# Altium footprint library cool_library.PcbLib: 1182 footprints (part 44 of 75)
Each footprint in its own frame and in the unit in brackets; x right, y up, seen from the top. Pads: shape width x height; smd on the part's side, far side on the other; paste and mask are expansions set on the pad; w line width, h text height; cw(c..) or ccw(c..) is an arc to the next point about the centre after c.
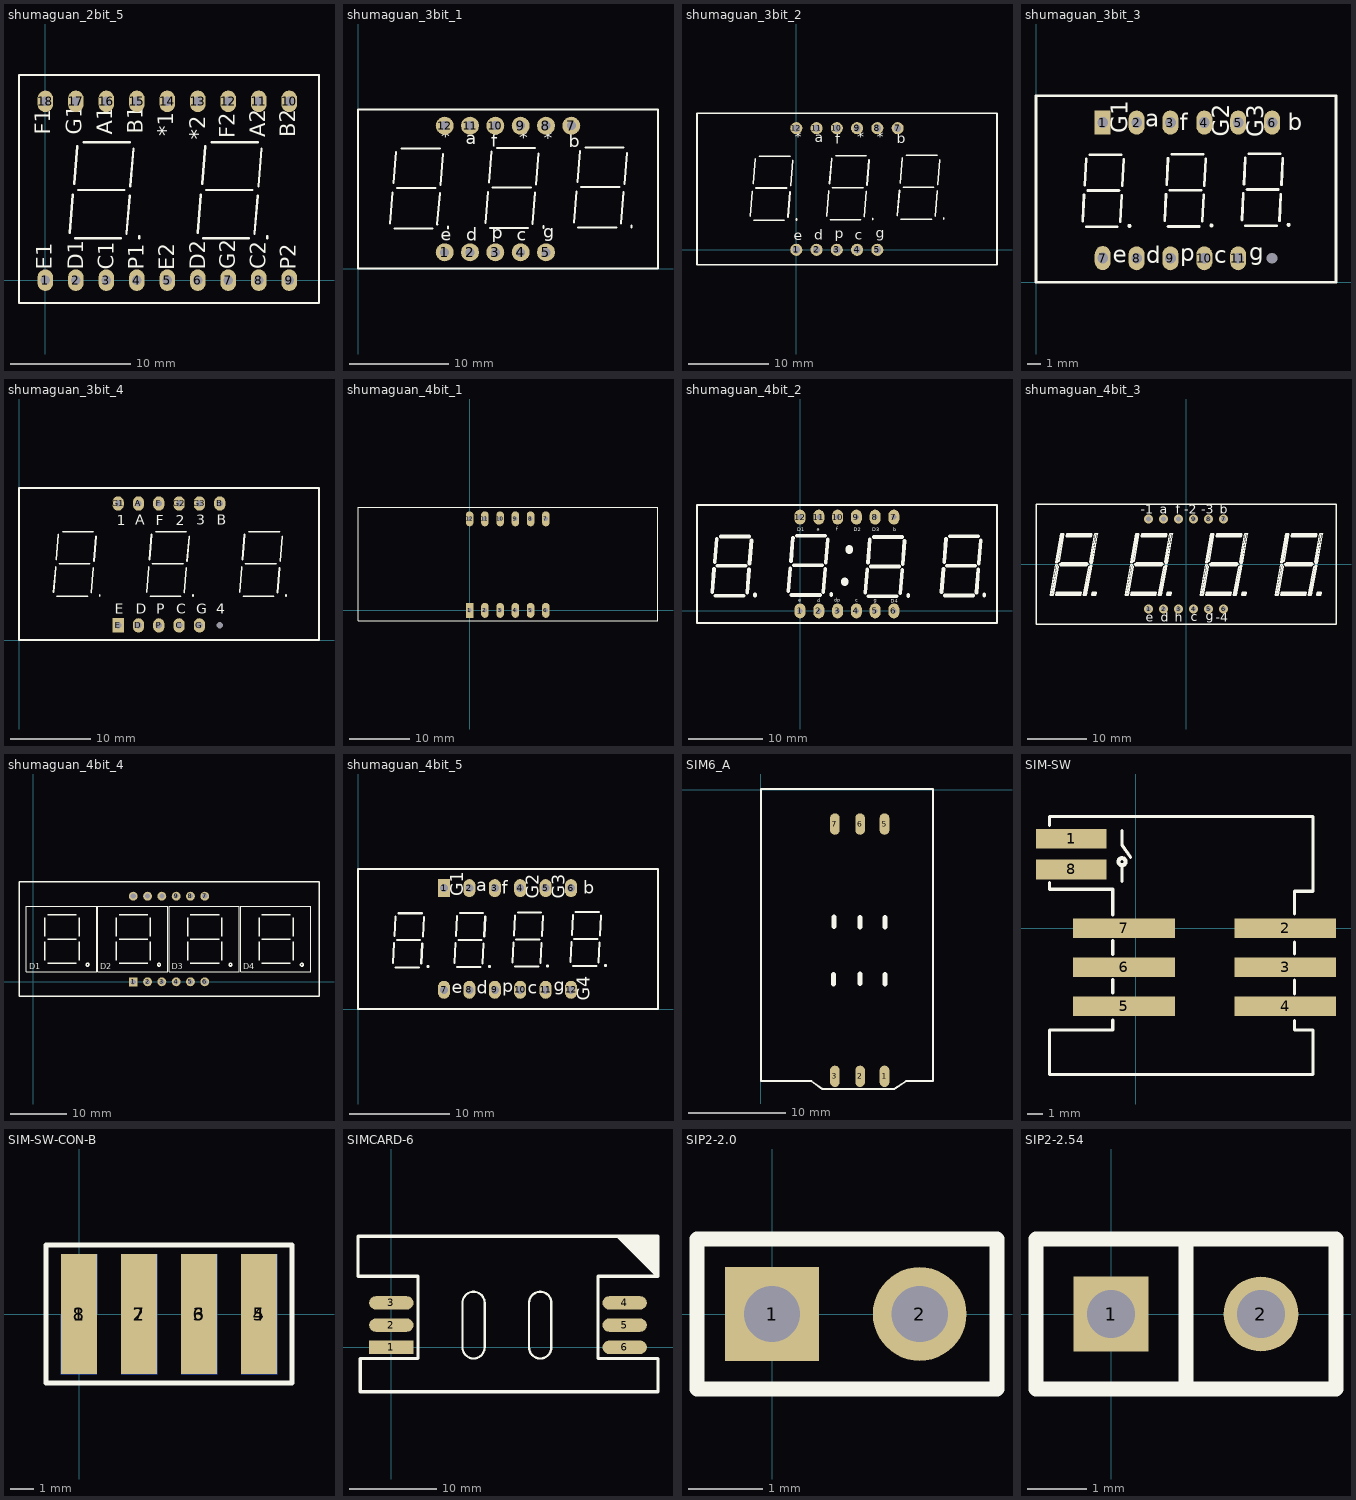
[diagram p43: the footprints below, top view; thin cyan lines are the x and y axes]

## shumaguan_2bit_5 [mm]
pads (18):
  oval 1.3x1.8 hole 0.8: 1(0,0) 2(2.54,0) 3(5.08,0) 4(7.62,0) 5(10.16,0) 6(12.7,0) 7(15.24,0) 8(17.78,0) 9(20.32,0) 10(20.32,14.9) 11(17.78,14.9) 12(15.24,14.9) 13(12.7,14.9) 14(10.16,14.9) 15(7.62,14.9) 16(5.08,14.9) 17(2.54,14.9) 18(0,14.9)
Bottom Layer:
  lines w0.2: 22.8,17 22.8,17.1
Top Overlay:
  lines w0.203: 2.034,3.962 2.288,7.112 ; 2.389,8.026 2.643,11.176 ; 2.465,3.48 6.301,3.48 ; 2.745,7.518 6.58,7.518 ; 3.177,11.506 7.012,11.506 ; 6.758,3.886 7.012,7.036 ; 7.088,7.823 7.342,10.973 ; 7.825,3.48 7.825,3.658 ; 12.702,3.962 12.956,7.112 ; 13.057,8.026 13.311,11.176 ; 13.133,3.48 16.969,3.48 ; 13.413,7.518 17.248,7.518 ; 13.845,11.506 17.68,11.506 ; 17.426,3.886 17.68,7.036 ; 17.756,7.823 18.01,10.973 ; 18.493,3.48 18.493,3.658 ; 22.8,17 22.8,-1.9 -2.2,-1.9 -2.2,17.1 22.8,17.1
  text "A1" at 5.588,12.116 h1.27
  text "A2" at 18.313,11.913 h1.27
  text "B1" at 8.103,12.192 h1.27
  text "B2" at 20.828,11.913 h1.27
  text "C1" at 5.715,0.864 h1.27
  text "C2" at 18.364,0.914 h1.27
  text "D1" at 3.175,0.889 h1.27
  text "D2" at 13.31,0.864 h1.27
  text "E1" at 0.533,0.889 h1.27
  text "E2" at 10.719,0.838 h1.27
  text "F1" at 0.406,12.116 h1.27
  text "F2" at 15.799,11.836 h1.27
  text "G1" at 3.023,12.116 h1.27
  text "G2" at 15.824,0.914 h1.27
  text "P1" at 8.204,0.889 h1.27
  text "P2" at 20.879,0.889 h1.27
  text "*1" at 10.643,11.989 h1.27
  text "*2" at 13.335,11.709 h1.27

## shumaguan_3bit_1 [mm]
pads (11):
  round 1.8 hole 0.9: 1(8.7,1.65) 2(11.24,1.65) 3(13.78,1.65) 4(16.32,1.65) 5(18.86,1.65) 7(21.4,14.35) 8(18.86,14.35) 9(16.32,14.35) 10(13.78,14.35) 11(11.24,14.35) 12(8.7,14.35)
Top Overlay:
  lines w0.203: 3.226,4.521 3.48,7.671 ; 3.581,8.585 3.835,11.735 ; 3.658,4.039 7.493,4.039 ; 3.937,8.077 7.772,8.077 ; 4.369,12.065 8.204,12.065 ; 7.95,4.445 8.204,7.595 ; 8.28,8.382 8.534,11.532 ; 9.017,4.039 9.017,4.216 ; 12.802,4.572 13.056,7.722 ; 13.157,8.636 13.411,11.786 ; 13.233,4.089 17.069,4.089 ; 13.513,8.128 17.348,8.128 ; 13.945,12.116 17.78,12.116 ; 17.526,4.496 17.78,7.645 ; 17.856,8.433 18.11,11.582 ; 18.593,4.089 18.593,4.267 ; 21.666,4.623 21.92,7.772 ; 22.022,8.687 22.276,11.836 ; 22.098,4.14 25.933,4.14 ; 22.377,8.179 26.213,8.179 ; 22.809,12.167 26.645,12.167 ; 26.391,4.547 26.645,7.696 ; 26.721,8.484 26.975,11.633 ; 27.457,4.14 27.457,4.318 ; 0,0 30.1,0 30.1,16 0,16 0,0
  text "e" at 8.305,2.794 h1.27
  text "d" at 10.871,2.819 h1.27
  text "c" at 15.926,2.819 h1.27
  text "p" at 13.437,3.023 h1.27
  text "*" at 8.331,12.624 h1.27
  text "g" at 18.567,3.099 h1.27
  text "f" at 13.36,12.243 h1.27
  text "b" at 21.158,12.167 h1.27
  text "*" at 16.18,12.548 h1.27
  text "a" at 10.82,12.471 h1.27
  text "*" at 18.618,12.497 h1.27

## shumaguan_3bit_2 [mil]
pads (11):
  round 60 hole 35.43: 1(0,0) 2(100,0) 3(200,0) 4(300,0) 5(400,0) 7(500,600) 8(400,600) 9(300,600) 10(200,600) 11(100,600) 12(0,600)
Top Overlay:
  lines w8: -490,674 990.32,674 ; -490,674.03 -490,-74 990.32,-74 990.32,674.03 ; -227,165 -217,289 ; -213,325 -203,449 ; -210,146 -59,146 ; -199,305 -48,305 ; -182,462 -31,462 ; -41,162 -31,286 ; -28,317 -18,441 ; 1,146 1,153 ; 150,167 160,291 ; 164,327 174,451 ; 167,148 318,148 ; 178,307 329,307 ; 195,464 346,464 ; 336,164 346,288 ; 349,319 359,443 ; 378,148 378,155 ; 499,169 509,293 ; 513,329 523,453 ; 516,150 667,150 ; 527,309 678,309 ; 544,466 695,466 ; 685,166 695,290 ; 698,321 708,445 ; 727,150 727,157
  text "e" at -12,48 h50
  text "d" at 89,49 h50
  text "c" at 288,49 h50
  text "p" at 190,57 h50
  text "*" at -8,534 h50
  text "g" at 392,60 h50
  text "f" at 192,523 h50
  text "b" at 496,525 h50
  text "*" at 301,534 h50
  text "a" at 90,530 h50
  text "*" at 397,533 h50

## shumaguan_3bit_3 [mm]
pads (12):
  rect 1.2x1.8 hole 0.8: 1(5.004,11.982)
  oval 1.2x1.8 hole 0.8: 2(7.544,11.982) 3(10.084,11.982) 4(12.624,11.982) 5(15.164,11.982) 6(17.704,11.982) 7(5.004,1.822) 8(7.544,1.806) 9(10.084,1.806) 10(12.624,1.806) 11(15.164,1.806)
  round 0 hole 0.8: 12(17.704,1.806)
Top Overlay:
  circle w0.25: c7.01,4.242 r0.025
  circle w0.25: c13.157,4.267 r0.025
  circle w0.25: c18.948,4.318 r0.025
  lines w0.203: 3.505,4.597 3.607,6.579 ; 3.658,7.29 3.759,9.271 ; 3.759,4.166 6.096,4.166 ; 3.886,6.883 6.223,6.883 ; 4.039,9.576 6.375,9.576 ; 6.325,4.547 6.426,6.528 ; 6.477,7.239 6.579,9.22 ; 9.652,4.623 9.754,6.604 ; 9.804,7.315 9.906,9.296 ; 9.906,4.191 12.243,4.191 ; 10.033,6.909 12.37,6.909 ; 10.185,9.601 12.522,9.601 ; 12.471,4.572 12.573,6.553 ; 12.624,7.264 12.725,9.246 ; 15.443,4.674 15.545,6.655 ; 15.596,7.366 15.697,9.347 ; 15.697,4.242 18.034,4.242 ; 15.824,6.96 18.161,6.96 ; 15.977,9.652 18.313,9.652 ; 18.263,4.623 18.364,6.604 ; 18.415,7.315 18.517,9.296 ; 0,0 22.5,0 22.5,14 0,14 0,0
  text "b" at 18.898,11.405 h1.27
  text "a" at 8.204,11.684 h1.27
  text "G1" at 6.883,11.176 h1.27
  text "G2" at 14.478,10.922 h1.27
  text "G3" at 17.069,10.897 h1.27
  text "c" at 13.36,1.422 h1.27
  text "d" at 8.28,1.422 h1.27
  text "e" at 5.766,1.473 h1.27
  text "f" at 10.77,11.405 h1.27
  text "g" at 15.977,1.651 h1.27
  text "p" at 10.82,1.575 h1.27

## shumaguan_3bit_4 [mm]
pads (12):
  round 0 hole 0.8: 6(25.095,1.824)
  oval 1.4x1.8 hole 0.8: A(14.935,17.064) B(25.095,17.064) C(20.015,1.824) D(14.935,1.824) F(17.475,17.064) G(22.555,1.824) G1(12.395,17.064) G2(20.015,17.064) G3(22.555,17.064) P(17.475,1.824)
  rect 1.4x1.8 hole 0.8: E(12.395,1.824)
Top Overlay:
  lines w0.203: 4.318,5.969 4.572,9.119 ; 4.674,10.033 4.928,13.183 ; 4.75,5.486 8.585,5.486 ; 5.029,9.525 8.865,9.525 ; 5.461,13.513 9.296,13.513 ; 9.042,5.893 9.296,9.042 ; 9.373,9.83 9.627,12.979 ; 10.109,5.486 10.109,5.664 ; 15.951,5.969 16.205,9.119 ; 16.307,10.033 16.561,13.183 ; 16.383,5.486 20.218,5.486 ; 16.662,9.525 20.498,9.525 ; 17.094,13.513 20.93,13.513 ; 20.676,5.893 20.93,9.042 ; 21.006,9.83 21.26,12.979 ; 21.742,5.486 21.742,5.664 ; 27.584,5.969 27.838,9.119 ; 27.94,10.033 28.194,13.183 ; 28.016,5.486 31.852,5.486 ; 28.296,9.525 32.131,9.525 ; 28.727,13.513 32.563,13.513 ; 32.309,5.893 32.563,9.042 ; 32.639,9.83 32.893,12.979 ; 33.376,5.486 33.376,5.664 ; 0,0 0,19 37.5,19 37.5,0 0,0
  text "4" at 24.663,3.277 h1.27
  text "G" at 22.149,3.277 h1.27
  text "C" at 19.66,3.251 h1.27
  text "P" at 17.145,3.277 h1.27
  text "D" at 14.58,3.251 h1.27
  text "E" at 11.938,3.277 h1.27
  text "B" at 24.689,14.376 h1.27
  text "3" at 22.149,14.376 h1.27
  text "2" at 19.609,14.351 h1.27
  text "F" at 17.069,14.351 h1.27
  text "A" at 14.529,14.427 h1.27
  text "1" at 12.217,14.351 h1.27

## shumaguan_4bit_1 [mm]
pads (12):
  rect 1.27x2.5 hole 0.7: 1(0.001,0.001)
  oval 1.27x2.5 hole 0.7: 2(2.541,0.001) 3(5.081,0.001) 4(7.621,0.001) 5(10.161,0.001) 6(12.701,0.001) 7(12.701,15.241) 8(10.161,15.241) 9(7.621,15.241) 10(5.081,15.241) 11(2.541,15.241) 12(0.001,15.241)
Top Overlay:
  lines w0.203: 31.4,-1.569 31.4,0 ; -18.6,-1.734 31.4,-1.734 31.4,17.166 -18.6,17.166 -18.6,-1.734

## shumaguan_4bit_2 [mm]
pads (12):
  oval 1.5x2 hole 0.7: 1(0,0) 2(2.54,0) 3(5.08,0) 4(7.62,0) 5(10.16,0) 6(12.695,0) 7(12.695,12.7) 8(10.16,12.7) 9(7.62,12.7) 10(5.08,12.7) 11(2.54,12.7) 12(0,12.7)
Top Overlay:
  lines w0.3: -13.95,-1.65 26.65,-1.65 26.65,14.35 -13.95,14.35 -13.95,-1.65
  lines w0.5: -11.893,2.541 -11.639,5.691 ; -11.537,6.605 -11.283,9.755 ; -11.461,2.058 -7.625,2.058 ; -11.181,6.097 -7.346,6.097 ; -10.75,10.085 -6.914,10.085 ; -7.168,2.465 -6.914,5.614 ; -6.838,6.402 -6.584,9.551 ; -6.101,2.058 -6.101,2.236 ; -1.58,2.643 -1.326,5.792 ; -1.225,6.707 -0.971,9.856 ; -1.148,2.16 2.687,2.16 ; -0.869,6.199 2.966,6.199 ; -0.437,10.186 3.398,10.186 ; 3.144,2.566 3.398,5.716 ; 3.474,6.503 3.728,9.653 ; 4.211,2.16 4.211,2.338 ; 8.834,2.465 9.088,5.614 ; 9.189,6.529 9.443,9.678 ; 9.266,1.982 13.101,1.982 ; 9.545,6.021 13.38,6.021 ; 9.977,10.009 13.812,10.009 ; 13.558,2.389 13.812,5.538 ; 13.888,6.326 14.142,9.475 ; 14.625,1.982 14.625,2.16 ; 19.146,2.566 19.4,5.716 ; 19.502,6.63 19.756,9.78 ; 19.578,2.084 23.413,2.084 ; 19.857,6.122 23.693,6.122 ; 20.289,10.11 24.125,10.11 ; 23.871,2.49 24.125,5.64 ; 24.201,6.427 24.455,9.577 ; 24.937,2.084 24.937,2.262
  lines w1: 6.065,3.862 6.065,4.04 ; 6.675,8.231 6.675,8.408
  text "dp" at 4.592,1.246 h0.5
  text "g" at 10.002,1.271 h0.5
  text "f" at 4.871,10.847 h0.5
  text "e" at -0.234,1.246 h0.5
  text "d" at 2.357,1.195 h0.5
  text "c" at 7.462,1.22 h0.5
  text "b" at 12.593,10.796 h0.5
  text "a" at 2.23,10.872 h0.5
  text "D4" at 12.237,1.093 h0.5
  text "D3" at 9.799,10.771 h0.5
  text "D2" at 7.259,10.771 h0.5
  text "D1" at -0.361,10.796 h0.5

## shumaguan_4bit_3 [mm]
pads (12):
  round 1.5 hole 0.9: 1(-6.35,-7.62) 2(-3.81,-7.62) 3(-1.27,-7.62) 4(1.27,-7.62) 5(3.81,-7.62) 6(6.35,-7.62) 7(6.35,7.62) 8(3.81,7.62) 9(1.27,7.62) 10(-1.27,7.62) 11(-3.81,7.62) 12(-6.35,7.62)
Top Overlay:
  drawing of 188 lines, arcs and shapes, not listed
  text "-1" at -7.645,8.484 h1.52
  text "a" at -4.445,8.509 h1.52
  text "f" at -1.778,8.509 h1.52
  text "-2" at -0.305,8.484 h1.52
  text "-3" at 2.591,8.484 h1.52
  text "b" at 5.715,8.509 h1.52
  text "-4" at 5.055,-9.804 h1.52
  text "g" at 3.302,-9.525 h1.52
  text "c" at 0.762,-9.652 h1.52
  text "h" at -1.905,-9.779 h1.52
  text "d" at -4.318,-9.779 h1.52
  text "e" at -6.858,-9.779 h1.52

## shumaguan_4bit_4 [mil]
pads (12):
  rect 62x62 hole 36: 1(700,0)
  round 62 hole 36: 2(800,0) 3(900,0) 4(1000,0) 5(1100,0) 6(1200,0) 7(1200,600) 8(1100,600) 9(1000,600) 10(900,600) 11(800,600) 12(700,600)
Top Overlay:
  circle w10: c1880,120 r10
  circle w10: c1380,120 r10
  circle w10: c880,120 r10
  circle w10: c380,120 r10
  lines w7.87: -49.21,70.28 442.91,70.28 442.91,528.15 -49.21,528.15 -49.21,323.82 -49.21,70.28 ; 450.79,70.28 942.91,70.28 942.91,528.15 450.79,528.15 450.79,323.82 450.79,70.28 ; 950.79,70.28 1442.91,70.28 1442.91,528.15 950.79,528.15 950.79,323.82 950.79,70.28 ; 1450.79,70.28 1942.91,70.28 1942.91,528.15 1450.79,528.15 1450.79,323.82 1450.79,70.28
  lines w10: 80,150 80,280 ; 80,320 80,450 ; 100,130 300,130 ; 100,300 300,300 ; 100,470 300,470 ; 320,150 320,280 ; 320,320 320,450 ; 580,150 580,280 ; 580,320 580,450 ; 600,130 800,130 ; 600,300 800,300 ; 600,470 800,470 ; 820,150 820,280 ; 820,320 820,450 ; 1080,150 1080,280 ; 1080,320 1080,450 ; 1100,130 1300,130 ; 1100,300 1300,300 ; 1100,470 1300,470 ; 1320,150 1320,280 ; 1320,320 1320,450 ; 1580,150 1580,280 ; 1580,320 1580,450 ; 1600,130 1800,130 ; 1600,300 1800,300 ; 1600,470 1800,470 ; 1820,150 1820,280 ; 1820,320 1820,450 ; -100,-100 -100,700 2000,700 2000,-100 -100,-100
  text "D4" at 1470,90 h40
  text "D3" at 970,90 h40
  text "D2" at 470,90 h40
  text "D1" at -30,90 h40

## shumaguan_4bit_5 [mm]
pads (12):
  rect 1.2x1.8 hole 0.8: 1(8.6,12.084)
  oval 1.2x1.8 hole 0.8: 2(11.14,12.084) 3(13.68,12.084) 4(16.22,12.084) 5(18.76,12.084) 6(21.3,12.084) 7(8.6,1.924) 8(11.14,1.924) 9(13.68,1.924) 10(16.22,1.924) 11(18.76,1.924) 12(21.3,1.924)
Top Overlay:
  circle w0.25: c7.01,4.242 r0.025
  circle w0.25: c13.157,4.267 r0.025
  circle w0.25: c18.948,4.318 r0.025
  circle w0.25: c24.74,4.369 r0.025
  lines w0.203: 3.505,4.597 3.607,6.579 ; 3.658,7.29 3.759,9.271 ; 3.759,4.166 6.096,4.166 ; 3.886,6.883 6.223,6.883 ; 4.039,9.576 6.375,9.576 ; 6.325,4.547 6.426,6.528 ; 6.477,7.239 6.579,9.22 ; 9.652,4.623 9.754,6.604 ; 9.804,7.315 9.906,9.296 ; 9.906,4.191 12.243,4.191 ; 10.033,6.909 12.37,6.909 ; 10.185,9.601 12.522,9.601 ; 12.471,4.572 12.573,6.553 ; 12.624,7.264 12.725,9.246 ; 15.443,4.674 15.545,6.655 ; 15.596,7.366 15.697,9.347 ; 15.697,4.242 18.034,4.242 ; 15.824,6.96 18.161,6.96 ; 15.977,9.652 18.313,9.652 ; 18.263,4.623 18.364,6.604 ; 18.415,7.315 18.517,9.296 ; 21.234,4.724 21.336,6.706 ; 21.387,7.417 21.488,9.398 ; 21.488,4.293 23.825,4.293 ; 21.615,7.01 23.952,7.01 ; 21.768,9.703 24.105,9.703 ; 24.054,4.674 24.155,6.655 ; 24.206,7.366 24.308,9.347 ; 0,0 30,0 30,14 0,14 0,0
  text "G4" at 23.18,0.822 h1.27
  text "p" at 14.417,1.683 h1.27
  text "g" at 19.573,1.759 h1.27
  text "f" at 14.391,11.513 h1.27
  text "e" at 9.362,1.581 h1.27
  text "d" at 11.877,1.531 h1.27
  text "c" at 16.957,1.531 h1.27
  text "G3" at 20.69,11.005 h1.27
  text "G2" at 18.1,11.03 h1.27
  text "G1" at 10.505,11.284 h1.27
  text "a" at 11.826,11.792 h1.27
  text "b" at 22.519,11.513 h1.27

## SIM6_A [mm]
pads (6):
  oval 1x2.2 smd: 1(12.709,-29.411) 2(10.209,-29.411) 3(7.609,-29.411) 5(12.709,-3.511) 6(10.209,-3.511) 7(7.609,-3.511)
Top Overlay:
  lines w0.203: 0.009,-29.911 5.209,-29.911 6.309,-30.711 13.709,-30.711 14.909,-29.911 17.709,-29.911 17.709,0.089 0.009,0.089 0.009,-29.911
  lines w0.508: 7.483,-19.931 7.483,-18.931 ; 7.534,-14.048 7.534,-13.048 ; 10.201,-19.905 10.201,-18.905 ; 10.201,-14.089 10.201,-13.089 ; 12.741,-19.956 12.741,-18.956 ; 12.741,-14.089 12.741,-13.089

## SIM-SW [mil]
pads (8):
  rect 180x50 smd: 1(-164.96,228.74) 8(-164.96,150)
  rect 260x50 smd: 2(382.24,0) 3(382.24,-100) 4(382.24,-200) 5(-30,-200) 6(-30,-100) 7(-30,0)
Top Overlay:
  circle w10: c-35.06,170 r9.06
  lines w8: -220.08,116.92 -220.08,99.41 -58.66,99.41 -58.66,34.34 ; -220.08,262.92 -220.08,285.24 453.15,285.24 453.15,94.29 405.91,94.29 406,94.29 406,36 ; -195,-374.21 453.15,-374.21 ; -164,-374.21 -220.08,-374.21 -220.08,-260.04 -158.08,-260.04 -58.66,-260.04 -58.66,-235.66 ; -58.66,-165.66 -58.66,-132 ; -58.66,-67 -58.66,-32 ; -35,120 -35,160 ; -35,250 -35,213 -13,181 ; 405.91,-235.91 405.91,-260.04 453.15,-260.04 453.15,-374.21 ; 405.91,-168 405.91,-133 ; 405.91,-66 405.91,-35 ; 424,-374.21 453.15,-374.21

## SIM-SW-CON-B [mil]
pads (8):
  rect 60x200 smd: 1(0,0) 2(100,0) 3(200,0) 4(300,0)
  rect 60x200 smd far side: 5(300,0) 6(200,0) 7(100,0) 8(0,0)
Top Overlay:
  lines w8: -55,-115 -55,115 355,115 355,-115 -55,-115

## SIMCARD-6 [mil]
pads (6):
  rect 200x60 smd: 1(0,0)
  oval 200x60 smd: 2(0,100) 3(0,200) 4(1050,200) 5(1050,100) 6(1050,0)
Top Overlay:
  lines w10: 320,0 ccw(c370,0) 420,0 420,200 ccw(c370,200) 320,200 320,0 ; 620,0 ccw(c670,0) 720,0 720,200 ccw(c670,200) 620,200 620,0
  lines w15: 1020,500 1200,320 ; 1040,500 1200,340 ; 1060,500 1200,360 ; 1080,500 1200,380 ; 1100,500 1200,400 ; 1120,500 1200,420 ; 1140,500 1200,440 ; 1160,500 1200,460 ; 1180,500 1200,480 ; 1200,320 1200,500 -150,500 -150,320 120,320 120,-50 -140,-50 -140,-200 1200,-200 1200,-50 930,-50 930,320 1200,320

## SIP2-2.0 [mil]
pads (2):
  rect 50x50 hole 30: 1(0,0)
  round 50 hole 30: 2(78.74,0)
Top Overlay:
  lines w8: -40,-40 120,-40 120,40 -40,40 -40,-40

## SIP2-2.54 [mil]
pads (2):
  rect 50x50 hole 32: 1(0,0)
  round 50 hole 32: 2(100,0)
Top Overlay:
  lines w10: 50,-50 50,50 ; -50,-50 150,-50 150,50 -50,50 -50,-50